# Altium integrated library Altium_WCAP-ATLI_rev19a.IntLib: 162 symbols (part 1 of 2) (continued)
## 860080580027
designator C?, comment 2200uF, 35V
WCAP-ATLI THT Aluminum Electrolytic Capacitors, D16mm x L35.5mm, 2200uF, +/-20%, 35VDC; Part Number: 860080580027; Dissipation Factor: 11%; Endurance: 5000h; Leakage Current: 770uA; Ripple Current max.: 3750mA; Technical Reference: ATEK355222M035DSPADE000; ComponentLink1Description: Manufacturer; ComponentLink1URL: http://www.we-online.de; ComponentLink2Description: Datasheet; ComponentLink2URL: https://katalog.we-online.com/pbs/datasheet/860080580027.pdf; Length: 35.5mm; Mounting Technology: THT; Operating Temperature: -55 to +105degC; Packaging: Ammo Pack; Published Date: August 2019; Capacitance: 2200uF; Diameter: 16mm; Publisher: Wurth Elektronik; Capacitance Tolerance: +/-20%; Rated Voltage: 35VDC
footprint WCAP-ATLI_16x35.5
pins: 1 N, 2 P

## 860080581028
designator C?, comment 2700uF, 35V
WCAP-ATLI THT Aluminum Electrolytic Capacitors, D18mm x L31.5mm, 2700uF, +/-20%, 35VDC; Part Number: 860080581028; Dissipation Factor: 11%; Endurance: 5000h; Leakage Current: 945uA; Ripple Current max.: 3850mA; Technical Reference: ATEL315272M035DSPAEE000; ComponentLink1Description: Manufacturer; ComponentLink1URL: http://www.we-online.de; ComponentLink2Description: Datasheet; ComponentLink2URL: https://katalog.we-online.com/pbs/datasheet/860080581028.pdf; Length: 31.5mm; Mounting Technology: THT; Operating Temperature: -55 to +105degC; Packaging: Ammo Pack; Published Date: August 2019; Capacitance: 2700uF; Diameter: 18mm; Publisher: Wurth Elektronik; Capacitance Tolerance: +/-20%; Rated Voltage: 35VDC
footprint WCAP-ATLI_18x31.5
pins: 1 N, 2 P

## 860080672001
designator C?, comment 22uF, 50V
WCAP-ATLI THT Aluminum Electrolytic Capacitors, D5mm x L11mm, 22uF, +/-20%, 50VDC; Part Number: 860080672001; Dissipation Factor: 8%; Endurance: 2000h; Leakage Current: 11uA; Ripple Current max.: 220mA; Technical Reference: ATEC110220M050DSPA3B000; ComponentLink1Description: Manufacturer; ComponentLink1URL: http://www.we-online.de; ComponentLink2Description: Datasheet; ComponentLink2URL: https://katalog.we-online.com/pbs/datasheet/860080672001.pdf; Length: 11mm; Mounting Technology: THT; Operating Temperature: -55 to +105degC; Packaging: Ammo Pack; Published Date: August 2019; Capacitance: 22uF; Diameter: 5mm; Publisher: Wurth Elektronik; Capacitance Tolerance: +/-20%; Rated Voltage: 50VDC
footprint WCAP-ATLI_5x11
pins: 1 N, 2 P

## 860080673002
designator C?, comment 27uF, 50V
WCAP-ATLI THT Aluminum Electrolytic Capacitors, D6.3mm x L11mm, 27uF, +/-20%, 50VDC; Part Number: 860080673002; Dissipation Factor: 8%; Endurance: 2000h; Leakage Current: 13.5uA; Ripple Current max.: 265mA; Technical Reference: ATED110270M050DSPA4B000; ComponentLink1Description: Manufacturer; ComponentLink1URL: http://www.we-online.de; ComponentLink2Description: Datasheet; ComponentLink2URL: https://katalog.we-online.com/pbs/datasheet/860080673002.pdf; Length: 11mm; Mounting Technology: THT; Operating Temperature: -55 to +105degC; Packaging: Ammo Pack; Published Date: August 2019; Capacitance: 27uF; Diameter: 6.3mm; Publisher: Wurth Elektronik; Capacitance Tolerance: +/-20%; Rated Voltage: 50VDC
footprint WCAP-ATLI_6.3x11
pins: 1 N, 2 P

## 860080673003
designator C?, comment 33uF, 50V
WCAP-ATLI THT Aluminum Electrolytic Capacitors, D6.3mm x L11mm, 33uF, +/-20%, 50VDC; Part Number: 860080673003; Dissipation Factor: 8%; Endurance: 2000h; Leakage Current: 16.5uA; Ripple Current max.: 280mA; Technical Reference: ATED110330M050DSPA4B000; ComponentLink1Description: Manufacturer; ComponentLink1URL: http://www.we-online.de; ComponentLink2Description: Datasheet; ComponentLink2URL: https://katalog.we-online.com/pbs/datasheet/860080673003.pdf; Length: 11mm; Mounting Technology: THT; Operating Temperature: -55 to +105degC; Packaging: Ammo Pack; Published Date: August 2019; Capacitance: 33uF; Diameter: 6.3mm; Publisher: Wurth Elektronik; Capacitance Tolerance: +/-20%; Rated Voltage: 50VDC
footprint WCAP-ATLI_6.3x11
pins: 1 N, 2 P

## 860080673004
designator C?, comment 39uF, 50V
WCAP-ATLI THT Aluminum Electrolytic Capacitors, D6.3mm x L11mm, 39uF, +/-20%, 50VDC; Part Number: 860080673004; Dissipation Factor: 8%; Endurance: 2000h; Leakage Current: 19.5uA; Ripple Current max.: 300mA; Technical Reference: ATED110390M050DSPA4B000; ComponentLink1Description: Manufacturer; ComponentLink1URL: http://www.we-online.de; ComponentLink2Description: Datasheet; ComponentLink2URL: https://katalog.we-online.com/pbs/datasheet/860080673004.pdf; Length: 11mm; Mounting Technology: THT; Operating Temperature: -55 to +105degC; Packaging: Ammo Pack; Published Date: August 2019; Capacitance: 39uF; Diameter: 6.3mm; Publisher: Wurth Elektronik; Capacitance Tolerance: +/-20%; Rated Voltage: 50VDC
footprint WCAP-ATLI_6.3x11
pins: 1 N, 2 P

## 860080674005
designator C?, comment 47uF, 50V
WCAP-ATLI THT Aluminum Electrolytic Capacitors, D8mm x L11.5mm, 47uF, +/-20%, 50VDC; Part Number: 860080674005; Dissipation Factor: 8%; Endurance: 3000h; Leakage Current: 23.5uA; Ripple Current max.: 360mA; Technical Reference: ATEE115470M050DSPA7C000; ComponentLink1Description: Manufacturer; ComponentLink1URL: http://www.we-online.de; ComponentLink2Description: Datasheet; ComponentLink2URL: https://katalog.we-online.com/pbs/datasheet/860080674005.pdf; Length: 11.5mm; Mounting Technology: THT; Operating Temperature: -55 to +105degC; Packaging: Ammo Pack; Published Date: August 2019; Capacitance: 47uF; Diameter: 8mm; Publisher: Wurth Elektronik; Capacitance Tolerance: +/-20%; Rated Voltage: 50VDC
footprint WCAP-ATLI_8x11.5
pins: 1 N, 2 P

## 860080674006
designator C?, comment 56uF, 50V
WCAP-ATLI THT Aluminum Electrolytic Capacitors, D8mm x L11.5mm, 56uF, +/-20%, 50VDC; Part Number: 860080674006; Dissipation Factor: 8%; Endurance: 3000h; Leakage Current: 28uA; Ripple Current max.: 375mA; Technical Reference: ATEE115560M050DSPA7C000; ComponentLink1Description: Manufacturer; ComponentLink1URL: http://www.we-online.de; ComponentLink2Description: Datasheet; ComponentLink2URL: https://katalog.we-online.com/pbs/datasheet/860080674006.pdf; Length: 11.5mm; Mounting Technology: THT; Operating Temperature: -55 to +105degC; Packaging: Ammo Pack; Published Date: August 2019; Capacitance: 56uF; Diameter: 8mm; Publisher: Wurth Elektronik; Capacitance Tolerance: +/-20%; Rated Voltage: 50VDC
footprint WCAP-ATLI_8x11.5
pins: 1 N, 2 P

## 860080674007
designator C?, comment 68uF, 50V
WCAP-ATLI THT Aluminum Electrolytic Capacitors, D8mm x L11.5mm, 68uF, +/-20%, 50VDC; Part Number: 860080674007; Dissipation Factor: 8%; Endurance: 3000h; Leakage Current: 34uA; Ripple Current max.: 400mA; Technical Reference: ATEE115680M050DSPA7C000; ComponentLink1Description: Manufacturer; ComponentLink1URL: http://www.we-online.de; ComponentLink2Description: Datasheet; ComponentLink2URL: https://katalog.we-online.com/pbs/datasheet/860080674007.pdf; Length: 11.5mm; Mounting Technology: THT; Operating Temperature: -55 to +105degC; Packaging: Ammo Pack; Published Date: August 2019; Capacitance: 68uF; Diameter: 8mm; Publisher: Wurth Elektronik; Capacitance Tolerance: +/-20%; Rated Voltage: 50VDC
footprint WCAP-ATLI_8x11.5
pins: 1 N, 2 P

## 860080674008
designator C?, comment 82uF, 50V
WCAP-ATLI THT Aluminum Electrolytic Capacitors, D8mm x L11.5mm, 82uF, +/-20%, 50VDC; Part Number: 860080674008; Dissipation Factor: 8%; Endurance: 3000h; Leakage Current: 41uA; Ripple Current max.: 550mA; Technical Reference: ATEE115820M050DSPA7C000; ComponentLink1Description: Manufacturer; ComponentLink1URL: http://www.we-online.de; ComponentLink2Description: Datasheet; ComponentLink2URL: https://katalog.we-online.com/pbs/datasheet/860080674008.pdf; Length: 11.5mm; Mounting Technology: THT; Operating Temperature: -55 to +105degC; Packaging: Ammo Pack; Published Date: August 2019; Capacitance: 82uF; Diameter: 8mm; Publisher: Wurth Elektronik; Capacitance Tolerance: +/-20%; Rated Voltage: 50VDC
footprint WCAP-ATLI_8x11.5
pins: 1 N, 2 P

## 860080674009
designator C?, comment 100uF, 50V
WCAP-ATLI THT Aluminum Electrolytic Capacitors, D8mm x L11.5mm, 100uF, +/-20%, 50VDC; Part Number: 860080674009; Dissipation Factor: 8%; Endurance: 3000h; Leakage Current: 50uA; Ripple Current max.: 730mA; Technical Reference: ATEE115101M050DSPA7C000; ComponentLink1Description: Manufacturer; ComponentLink1URL: http://www.we-online.de; ComponentLink2Description: Datasheet; ComponentLink2URL: https://katalog.we-online.com/pbs/datasheet/860080674009.pdf; Length: 11.5mm; Mounting Technology: THT; Operating Temperature: -55 to +105degC; Packaging: Ammo Pack; Published Date: August 2019; Capacitance: 100uF; Diameter: 8mm; Publisher: Wurth Elektronik; Capacitance Tolerance: +/-20%; Rated Voltage: 50VDC
footprint WCAP-ATLI_8x11.5
pins: 1 N, 2 P

## 860080674010
designator C?, comment 120uF, 50V
WCAP-ATLI THT Aluminum Electrolytic Capacitors, D8mm x L16mm, 120uF, +/-20%, 50VDC; Part Number: 860080674010; Dissipation Factor: 8%; Endurance: 3000h; Leakage Current: 60uA; Ripple Current max.: 770mA; Technical Reference: ATEE160121M050DSPA7C000; ComponentLink1Description: Manufacturer; ComponentLink1URL: http://www.we-online.de; ComponentLink2Description: Datasheet; ComponentLink2URL: https://katalog.we-online.com/pbs/datasheet/860080674010.pdf; Length: 16mm; Mounting Technology: THT; Operating Temperature: -55 to +105degC; Packaging: Ammo Pack; Published Date: August 2019; Capacitance: 120uF; Diameter: 8mm; Publisher: Wurth Elektronik; Capacitance Tolerance: +/-20%; Rated Voltage: 50VDC
footprint WCAP-ATLI_8x16
pins: 1 N, 2 P

## 860080674013
designator C?, comment 180uF, 50V
WCAP-ATLI THT Aluminum Electrolytic Capacitors, D8mm x L20mm, 180uF, +/-20%, 50VDC; Part Number: 860080674013; Dissipation Factor: 8%; Endurance: 3000h; Leakage Current: 90uA; Ripple Current max.: 1060mA; Technical Reference: ATEE200181M050DSPA7C000; ComponentLink1Description: Manufacturer; ComponentLink1URL: http://www.we-online.de; ComponentLink2Description: Datasheet; ComponentLink2URL: https://katalog.we-online.com/pbs/datasheet/860080674013.pdf; Length: 20mm; Mounting Technology: THT; Operating Temperature: -55 to +105degC; Packaging: Ammo Pack; Published Date: August 2019; Capacitance: 180uF; Diameter: 8mm; Publisher: Wurth Elektronik; Capacitance Tolerance: +/-20%; Rated Voltage: 50VDC
footprint WCAP-ATLI_8x20
pins: 1 N, 2 P

## 860080675011
designator C?, comment 120uF, 50V
WCAP-ATLI THT Aluminum Electrolytic Capacitors, D10mm x L12.5mm, 120uF, +/-20%, 50VDC; Part Number: 860080675011; Dissipation Factor: 8%; Endurance: 5000h; Leakage Current: 60uA; Ripple Current max.: 790mA; Technical Reference: ATEF125121M050DSPA9E000; ComponentLink1Description: Manufacturer; ComponentLink1URL: http://www.we-online.de; ComponentLink2Description: Datasheet; ComponentLink2URL: https://katalog.we-online.com/pbs/datasheet/860080675011.pdf; Length: 12.5mm; Mounting Technology: THT; Operating Temperature: -55 to +105degC; Packaging: Ammo Pack; Published Date: August 2019; Capacitance: 120uF; Diameter: 10mm; Publisher: Wurth Elektronik; Capacitance Tolerance: +/-20%; Rated Voltage: 50VDC
footprint WCAP-ATLI_10x12.5
pins: 1 N, 2 P

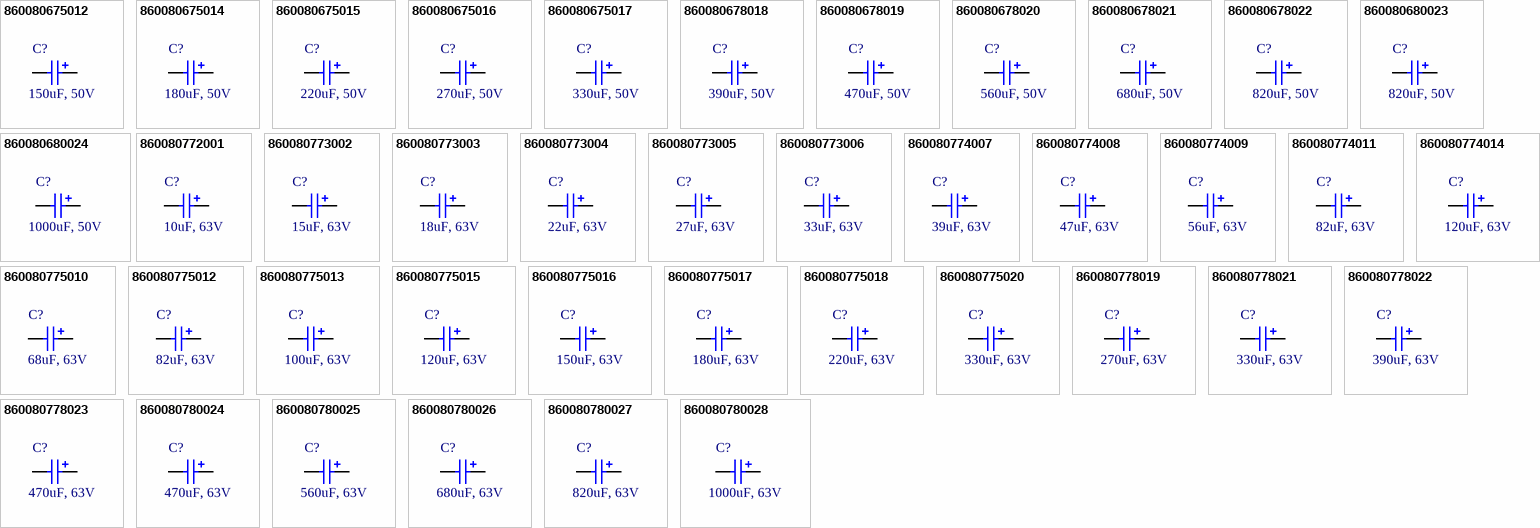
[diagram p3: symbols 860080675012 to 860080780028]

## 860080675012
designator C?, comment 150uF, 50V
WCAP-ATLI THT Aluminum Electrolytic Capacitors, D10mm x L12.5mm, 150uF, +/-20%, 50VDC; Part Number: 860080675012; Dissipation Factor: 8%; Endurance: 5000h; Leakage Current: 75uA; Ripple Current max.: 870mA; Technical Reference: ATEF125151M050DSPA9E000; ComponentLink1Description: Manufacturer; ComponentLink1URL: http://www.we-online.de; ComponentLink2Description: Datasheet; ComponentLink2URL: https://katalog.we-online.com/pbs/datasheet/860080675012.pdf; Length: 12.5mm; Mounting Technology: THT; Operating Temperature: -55 to +105degC; Packaging: Ammo Pack; Published Date: August 2019; Capacitance: 150uF; Diameter: 10mm; Publisher: Wurth Elektronik; Capacitance Tolerance: +/-20%; Rated Voltage: 50VDC
footprint WCAP-ATLI_10x12.5
pins: 1 N, 2 P

## 860080675014
designator C?, comment 180uF, 50V
WCAP-ATLI THT Aluminum Electrolytic Capacitors, D10mm x L16mm, 180uF, +/-20%, 50VDC; Part Number: 860080675014; Dissipation Factor: 8%; Endurance: 5000h; Leakage Current: 90uA; Ripple Current max.: 1090mA; Technical Reference: ATEF160181M050DSPAAE000; ComponentLink1Description: Manufacturer; ComponentLink1URL: http://www.we-online.de; ComponentLink2Description: Datasheet; ComponentLink2URL: https://katalog.we-online.com/pbs/datasheet/860080675014.pdf; Length: 16mm; Mounting Technology: THT; Operating Temperature: -55 to +105degC; Packaging: Ammo Pack; Published Date: August 2019; Capacitance: 180uF; Diameter: 10mm; Publisher: Wurth Elektronik; Capacitance Tolerance: +/-20%; Rated Voltage: 50VDC
footprint WCAP-ATLI_10x16
pins: 1 N, 2 P

## 860080675015
designator C?, comment 220uF, 50V
WCAP-ATLI THT Aluminum Electrolytic Capacitors, D10mm x L16mm, 220uF, +/-20%, 50VDC; Part Number: 860080675015; Dissipation Factor: 8%; Endurance: 5000h; Leakage Current: 110uA; Ripple Current max.: 1385mA; Technical Reference: ATEF160221M050DSPAAE000; ComponentLink1Description: Manufacturer; ComponentLink1URL: http://www.we-online.de; ComponentLink2Description: Datasheet; ComponentLink2URL: https://katalog.we-online.com/pbs/datasheet/860080675015.pdf; Length: 16mm; Mounting Technology: THT; Operating Temperature: -55 to +105degC; Packaging: Ammo Pack; Published Date: August 2019; Capacitance: 220uF; Diameter: 10mm; Publisher: Wurth Elektronik; Capacitance Tolerance: +/-20%; Rated Voltage: 50VDC
footprint WCAP-ATLI_10x16
pins: 1 N, 2 P

## 860080675016
designator C?, comment 270uF, 50V
WCAP-ATLI THT Aluminum Electrolytic Capacitors, D10mm x L20mm, 270uF, +/-20%, 50VDC; Part Number: 860080675016; Dissipation Factor: 8%; Endurance: 5000h; Leakage Current: 135uA; Ripple Current max.: 1500mA; Technical Reference: ATEF200271M050DSPAAE000; ComponentLink1Description: Manufacturer; ComponentLink1URL: http://www.we-online.de; ComponentLink2Description: Datasheet; ComponentLink2URL: https://katalog.we-online.com/pbs/datasheet/860080675016.pdf; Length: 20mm; Mounting Technology: THT; Operating Temperature: -55 to +105degC; Packaging: Ammo Pack; Published Date: August 2019; Capacitance: 270uF; Diameter: 10mm; Publisher: Wurth Elektronik; Capacitance Tolerance: +/-20%; Rated Voltage: 50VDC
footprint WCAP-ATLI_10x20
pins: 1 N, 2 P

## 860080675017
designator C?, comment 330uF, 50V
WCAP-ATLI THT Aluminum Electrolytic Capacitors, D10mm x L25mm, 330uF, +/-20%, 50VDC; Part Number: 860080675017; Dissipation Factor: 8%; Endurance: 5000h; Leakage Current: 165uA; Ripple Current max.: 1850mA; Technical Reference: ATEF250331M050DSPAAE000; ComponentLink1Description: Manufacturer; ComponentLink1URL: http://www.we-online.de; ComponentLink2Description: Datasheet; ComponentLink2URL: https://katalog.we-online.com/pbs/datasheet/860080675017.pdf; Length: 25mm; Mounting Technology: THT; Operating Temperature: -55 to +105degC; Packaging: Ammo Pack; Published Date: August 2019; Capacitance: 330uF; Diameter: 10mm; Publisher: Wurth Elektronik; Capacitance Tolerance: +/-20%; Rated Voltage: 50VDC
footprint WCAP-ATLI_10x25
pins: 1 N, 2 P

## 860080678018
designator C?, comment 390uF, 50V
WCAP-ATLI THT Aluminum Electrolytic Capacitors, D13mm x L20mm, 390uF, +/-20%, 50VDC; Part Number: 860080678018; Dissipation Factor: 8%; Endurance: 5000h; Leakage Current: 195uA; Ripple Current max.: 1910mA; Technical Reference: ATEI200391M050DSPACE000; ComponentLink1Description: Manufacturer; ComponentLink1URL: http://www.we-online.de; ComponentLink2Description: Datasheet; ComponentLink2URL: https://katalog.we-online.com/pbs/datasheet/860080678018.pdf; Length: 20mm; Mounting Technology: THT; Operating Temperature: -55 to +105degC; Packaging: Ammo Pack; Published Date: August 2019; Capacitance: 390uF; Diameter: 13mm; Publisher: Wurth Elektronik; Capacitance Tolerance: +/-20%; Rated Voltage: 50VDC
footprint WCAP-ATLI_13x20
pins: 1 N, 2 P

## 860080678019
designator C?, comment 470uF, 50V
WCAP-ATLI THT Aluminum Electrolytic Capacitors, D13mm x L20mm, 470uF, +/-20%, 50VDC; Part Number: 860080678019; Dissipation Factor: 8%; Endurance: 5000h; Leakage Current: 235uA; Ripple Current max.: 2000mA; Technical Reference: ATEI200471M050DSPACE000; ComponentLink1Description: Manufacturer; ComponentLink1URL: http://www.we-online.de; ComponentLink2Description: Datasheet; ComponentLink2URL: https://katalog.we-online.com/pbs/datasheet/860080678019.pdf; Length: 20mm; Mounting Technology: THT; Operating Temperature: -55 to +105degC; Packaging: Ammo Pack; Published Date: August 2019; Capacitance: 470uF; Diameter: 13mm; Publisher: Wurth Elektronik; Capacitance Tolerance: +/-20%; Rated Voltage: 50VDC
footprint WCAP-ATLI_13x20
pins: 1 N, 2 P

## 860080678020
designator C?, comment 560uF, 50V
WCAP-ATLI THT Aluminum Electrolytic Capacitors, D13mm x L20mm, 560uF, +/-20%, 50VDC; Part Number: 860080678020; Dissipation Factor: 8%; Endurance: 5000h; Leakage Current: 280uA; Ripple Current max.: 2150mA; Technical Reference: ATEI200561M050DSPACE000; ComponentLink1Description: Manufacturer; ComponentLink1URL: http://www.we-online.de; ComponentLink2Description: Datasheet; ComponentLink2URL: https://katalog.we-online.com/pbs/datasheet/860080678020.pdf; Length: 20mm; Mounting Technology: THT; Operating Temperature: -55 to +105degC; Packaging: Ammo Pack; Published Date: August 2019; Capacitance: 560uF; Diameter: 13mm; Publisher: Wurth Elektronik; Capacitance Tolerance: +/-20%; Rated Voltage: 50VDC
footprint WCAP-ATLI_13x20
pins: 1 N, 2 P

## 860080678021
designator C?, comment 680uF, 50V
WCAP-ATLI THT Aluminum Electrolytic Capacitors, D13mm x L25mm, 680uF, +/-20%, 50VDC; Part Number: 860080678021; Dissipation Factor: 8%; Endurance: 5000h; Leakage Current: 340uA; Ripple Current max.: 2490mA; Technical Reference: ATEI250681M050DSPACE000; ComponentLink1Description: Manufacturer; ComponentLink1URL: http://www.we-online.de; ComponentLink2Description: Datasheet; ComponentLink2URL: https://katalog.we-online.com/pbs/datasheet/860080678021.pdf; Length: 25mm; Mounting Technology: THT; Operating Temperature: -55 to +105degC; Packaging: Ammo Pack; Published Date: August 2019; Capacitance: 680uF; Diameter: 13mm; Publisher: Wurth Elektronik; Capacitance Tolerance: +/-20%; Rated Voltage: 50VDC
footprint WCAP-ATLI_13x25
pins: 1 N, 2 P

## 860080678022
designator C?, comment 820uF, 50V
WCAP-ATLI THT Aluminum Electrolytic Capacitors, D13mm x L30mm, 820uF, +/-20%, 50VDC; Part Number: 860080678022; Dissipation Factor: 8%; Endurance: 5000h; Leakage Current: 410uA; Ripple Current max.: 2770mA; Technical Reference: ATEI300821M050DSPACE000; ComponentLink1Description: Manufacturer; ComponentLink1URL: http://www.we-online.de; ComponentLink2Description: Datasheet; ComponentLink2URL: https://katalog.we-online.com/pbs/datasheet/860080678022.pdf; Length: 30mm; Mounting Technology: THT; Operating Temperature: -55 to +105degC; Packaging: Ammo Pack; Published Date: August 2019; Capacitance: 820uF; Diameter: 13mm; Publisher: Wurth Elektronik; Capacitance Tolerance: +/-20%; Rated Voltage: 50VDC
footprint WCAP-ATLI_13x30
pins: 1 N, 2 P

## 860080680023
designator C?, comment 820uF, 50V
WCAP-ATLI THT Aluminum Electrolytic Capacitors, D16mm x L25mm, 820uF, +/-20%, 50VDC; Part Number: 860080680023; Dissipation Factor: 8%; Endurance: 5000h; Leakage Current: 410uA; Ripple Current max.: 2960mA; Technical Reference: ATEK250821M050DSPAEE000; ComponentLink1Description: Manufacturer; ComponentLink1URL: http://www.we-online.de; ComponentLink2Description: Datasheet; ComponentLink2URL: https://katalog.we-online.com/pbs/datasheet/860080680023.pdf; Length: 25mm; Mounting Technology: THT; Operating Temperature: -55 to +105degC; Packaging: Ammo Pack; Published Date: August 2019; Capacitance: 820uF; Diameter: 16mm; Publisher: Wurth Elektronik; Capacitance Tolerance: +/-20%; Rated Voltage: 50VDC
footprint WCAP-ATLI_16x25
pins: 1 N, 2 P

## 860080680024
designator C?, comment 1000uF, 50V
WCAP-ATLI THT Aluminum Electrolytic Capacitors, D16mm x L25mm, 1000uF, +/-20%, 50VDC; Part Number: 860080680024; Dissipation Factor: 8%; Endurance: 5000h; Leakage Current: 500uA; Ripple Current max.: 3000mA; Technical Reference: ATEK250102M050DSPAEE000; ComponentLink1Description: Manufacturer; ComponentLink1URL: http://www.we-online.de; ComponentLink2Description: Datasheet; ComponentLink2URL: https://katalog.we-online.com/pbs/datasheet/860080680024.pdf; Length: 25mm; Mounting Technology: THT; Operating Temperature: -55 to +105degC; Packaging: Ammo Pack; Published Date: August 2019; Capacitance: 1000uF; Diameter: 16mm; Publisher: Wurth Elektronik; Capacitance Tolerance: +/-20%; Rated Voltage: 50VDC
footprint WCAP-ATLI_16x25
pins: 1 N, 2 P

## 860080772001
designator C?, comment 10uF, 63V
WCAP-ATLI THT Aluminum Electrolytic Capacitors, D5mm x L11mm, 10uF, +/-20%, 63VDC; Part Number: 860080772001; Dissipation Factor: 8%; Endurance: 2000h; Leakage Current: 6.3uA; Ripple Current max.: 135mA; Technical Reference: ATEC110100M063DSPA3B000; ComponentLink1Description: Manufacturer; ComponentLink1URL: http://www.we-online.de; ComponentLink2Description: Datasheet; ComponentLink2URL: https://katalog.we-online.com/pbs/datasheet/860080772001.pdf; Length: 11mm; Mounting Technology: THT; Operating Temperature: -55 to +105degC; Packaging: Ammo Pack; Published Date: August 2019; Capacitance: 10uF; Diameter: 5mm; Publisher: Wurth Elektronik; Capacitance Tolerance: +/-20%; Rated Voltage: 63VDC
footprint WCAP-ATLI_5x11
pins: 1 N, 2 P

## 860080773002
designator C?, comment 15uF, 63V
WCAP-ATLI THT Aluminum Electrolytic Capacitors, D6.3mm x L11mm, 15uF, +/-20%, 63VDC; Part Number: 860080773002; Dissipation Factor: 8%; Endurance: 2000h; Leakage Current: 9.45uA; Ripple Current max.: 168mA; Technical Reference: ATED110150M063DSPA4B000; ComponentLink1Description: Manufacturer; ComponentLink1URL: http://www.we-online.de; ComponentLink2Description: Datasheet; ComponentLink2URL: https://katalog.we-online.com/pbs/datasheet/860080773002.pdf; Length: 11mm; Mounting Technology: THT; Operating Temperature: -55 to +105degC; Packaging: Ammo Pack; Published Date: August 2019; Capacitance: 15uF; Diameter: 6.3mm; Publisher: Wurth Elektronik; Capacitance Tolerance: +/-20%; Rated Voltage: 63VDC
footprint WCAP-ATLI_6.3x11
pins: 1 N, 2 P

## 860080773003
designator C?, comment 18uF, 63V
WCAP-ATLI THT Aluminum Electrolytic Capacitors, D6.3mm x L11mm, 18uF, +/-20%, 63VDC; Part Number: 860080773003; Dissipation Factor: 8%; Endurance: 2000h; Leakage Current: 11.34uA; Ripple Current max.: 170mA; Technical Reference: ATED110180M063DSPA4B000; ComponentLink1Description: Manufacturer; ComponentLink1URL: http://www.we-online.de; ComponentLink2Description: Datasheet; ComponentLink2URL: https://katalog.we-online.com/pbs/datasheet/860080773003.pdf; Length: 11mm; Mounting Technology: THT; Operating Temperature: -55 to +105degC; Packaging: Ammo Pack; Published Date: August 2019; Capacitance: 18uF; Diameter: 6.3mm; Publisher: Wurth Elektronik; Capacitance Tolerance: +/-20%; Rated Voltage: 63VDC
footprint WCAP-ATLI_6.3x11
pins: 1 N, 2 P

## 860080773004
designator C?, comment 22uF, 63V
WCAP-ATLI THT Aluminum Electrolytic Capacitors, D6.3mm x L11mm, 22uF, +/-20%, 63VDC; Part Number: 860080773004; Dissipation Factor: 8%; Endurance: 2000h; Leakage Current: 13.86uA; Ripple Current max.: 250mA; Technical Reference: ATED110220M063DSPA4B000; ComponentLink1Description: Manufacturer; ComponentLink1URL: http://www.we-online.de; ComponentLink2Description: Datasheet; ComponentLink2URL: https://katalog.we-online.com/pbs/datasheet/860080773004.pdf; Length: 11mm; Mounting Technology: THT; Operating Temperature: -55 to +105degC; Packaging: Ammo Pack; Published Date: August 2019; Capacitance: 22uF; Diameter: 6.3mm; Publisher: Wurth Elektronik; Capacitance Tolerance: +/-20%; Rated Voltage: 63VDC
footprint WCAP-ATLI_6.3x11
pins: 1 N, 2 P

## 860080773005
designator C?, comment 27uF, 63V
WCAP-ATLI THT Aluminum Electrolytic Capacitors, D6.3mm x L11mm, 27uF, +/-20%, 63VDC; Part Number: 860080773005; Dissipation Factor: 8%; Endurance: 2000h; Leakage Current: 17.01uA; Ripple Current max.: 260mA; Technical Reference: ATED110270M063DSPA4B000; ComponentLink1Description: Manufacturer; ComponentLink1URL: http://www.we-online.de; ComponentLink2Description: Datasheet; ComponentLink2URL: https://katalog.we-online.com/pbs/datasheet/860080773005.pdf; Length: 11mm; Mounting Technology: THT; Operating Temperature: -55 to +105degC; Packaging: Ammo Pack; Published Date: August 2019; Capacitance: 27uF; Diameter: 6.3mm; Publisher: Wurth Elektronik; Capacitance Tolerance: +/-20%; Rated Voltage: 63VDC
footprint WCAP-ATLI_6.3x11
pins: 1 N, 2 P

## 860080773006
designator C?, comment 33uF, 63V
WCAP-ATLI THT Aluminum Electrolytic Capacitors, D6.3mm x L11mm, 33uF, +/-20%, 63VDC; Part Number: 860080773006; Dissipation Factor: 8%; Endurance: 2000h; Leakage Current: 20.79uA; Ripple Current max.: 270mA; Technical Reference: ATED110330M063DSPA4B000; ComponentLink1Description: Manufacturer; ComponentLink1URL: http://www.we-online.de; ComponentLink2Description: Datasheet; ComponentLink2URL: https://katalog.we-online.com/pbs/datasheet/860080773006.pdf; Length: 11mm; Mounting Technology: THT; Operating Temperature: -55 to +105degC; Packaging: Ammo Pack; Published Date: August 2019; Capacitance: 33uF; Diameter: 6.3mm; Publisher: Wurth Elektronik; Capacitance Tolerance: +/-20%; Rated Voltage: 63VDC
footprint WCAP-ATLI_6.3x11
pins: 1 N, 2 P

## 860080774007
designator C?, comment 39uF, 63V
WCAP-ATLI THT Aluminum Electrolytic Capacitors, D8mm x L11.5mm, 39uF, +/-20%, 63VDC; Part Number: 860080774007; Dissipation Factor: 8%; Endurance: 3000h; Leakage Current: 24.57uA; Ripple Current max.: 320mA; Technical Reference: ATEE115390M063DSPA7C000; ComponentLink1Description: Manufacturer; ComponentLink1URL: http://www.we-online.de; ComponentLink2Description: Datasheet; ComponentLink2URL: https://katalog.we-online.com/pbs/datasheet/860080774007.pdf; Length: 11.5mm; Mounting Technology: THT; Operating Temperature: -55 to +105degC; Packaging: Ammo Pack; Published Date: August 2019; Capacitance: 39uF; Diameter: 8mm; Publisher: Wurth Elektronik; Capacitance Tolerance: +/-20%; Rated Voltage: 63VDC
footprint WCAP-ATLI_8x11.5
pins: 1 N, 2 P

## 860080774008
designator C?, comment 47uF, 63V
WCAP-ATLI THT Aluminum Electrolytic Capacitors, D8mm x L11.5mm, 47uF, +/-20%, 63VDC; Part Number: 860080774008; Dissipation Factor: 8%; Endurance: 3000h; Leakage Current: 29.61uA; Ripple Current max.: 400mA; Technical Reference: ATEE115470M063DSPA7C000; ComponentLink1Description: Manufacturer; ComponentLink1URL: http://www.we-online.de; ComponentLink2Description: Datasheet; ComponentLink2URL: https://katalog.we-online.com/pbs/datasheet/860080774008.pdf; Length: 11.5mm; Mounting Technology: THT; Operating Temperature: -55 to +105degC; Packaging: Ammo Pack; Published Date: August 2019; Capacitance: 47uF; Diameter: 8mm; Publisher: Wurth Elektronik; Capacitance Tolerance: +/-20%; Rated Voltage: 63VDC
footprint WCAP-ATLI_8x11.5
pins: 1 N, 2 P

## 860080774009
designator C?, comment 56uF, 63V
WCAP-ATLI THT Aluminum Electrolytic Capacitors, D8mm x L11.5mm, 56uF, +/-20%, 63VDC; Part Number: 860080774009; Dissipation Factor: 8%; Endurance: 3000h; Leakage Current: 35.28uA; Ripple Current max.: 420mA; Technical Reference: ATEE115560M063DSPA7C000; ComponentLink1Description: Manufacturer; ComponentLink1URL: http://www.we-online.de; ComponentLink2Description: Datasheet; ComponentLink2URL: https://katalog.we-online.com/pbs/datasheet/860080774009.pdf; Length: 11.5mm; Mounting Technology: THT; Operating Temperature: -55 to +105degC; Packaging: Ammo Pack; Published Date: August 2019; Capacitance: 56uF; Diameter: 8mm; Publisher: Wurth Elektronik; Capacitance Tolerance: +/-20%; Rated Voltage: 63VDC
footprint WCAP-ATLI_8x11.5
pins: 1 N, 2 P

## 860080774011
designator C?, comment 82uF, 63V
WCAP-ATLI THT Aluminum Electrolytic Capacitors, D8mm x L16mm, 82uF, +/-20%, 63VDC; Part Number: 860080774011; Dissipation Factor: 8%; Endurance: 3000h; Leakage Current: 51.66uA; Ripple Current max.: 540mA; Technical Reference: ATEE160820M063DSPA7C000; ComponentLink1Description: Manufacturer; ComponentLink1URL: http://www.we-online.de; ComponentLink2Description: Datasheet; ComponentLink2URL: https://katalog.we-online.com/pbs/datasheet/860080774011.pdf; Length: 16mm; Mounting Technology: THT; Operating Temperature: -55 to +105degC; Packaging: Ammo Pack; Published Date: August 2019; Capacitance: 82uF; Diameter: 8mm; Publisher: Wurth Elektronik; Capacitance Tolerance: +/-20%; Rated Voltage: 63VDC
footprint WCAP-ATLI_8x16
pins: 1 N, 2 P

## 860080774014
designator C?, comment 120uF, 63V
WCAP-ATLI THT Aluminum Electrolytic Capacitors, D8mm x L20mm, 120uF, +/-20%, 63VDC; Part Number: 860080774014; Dissipation Factor: 8%; Endurance: 3000h; Leakage Current: 75.6uA; Ripple Current max.: 790mA; Technical Reference: ATEE200121M063DSPA7C000; ComponentLink1Description: Manufacturer; ComponentLink1URL: http://www.we-online.de; ComponentLink2Description: Datasheet; ComponentLink2URL: https://katalog.we-online.com/pbs/datasheet/860080774014.pdf; Length: 20mm; Mounting Technology: THT; Operating Temperature: -55 to +105degC; Packaging: Ammo Pack; Published Date: August 2019; Capacitance: 120uF; Diameter: 8mm; Publisher: Wurth Elektronik; Capacitance Tolerance: +/-20%; Rated Voltage: 63VDC
footprint WCAP-ATLI_8x20
pins: 1 N, 2 P